# Altium footprint library 全库.PcbLib: 967 footprints (part 47 of 61)
Each footprint in its own frame and in the unit in brackets; x right, y up, seen from the top. Pads: shape width x height; smd on the part's side, far side on the other; paste and mask are expansions set on the pad; w line width, h text height; cw(c..) or ccw(c..) is an arc to the next point about the centre after c.
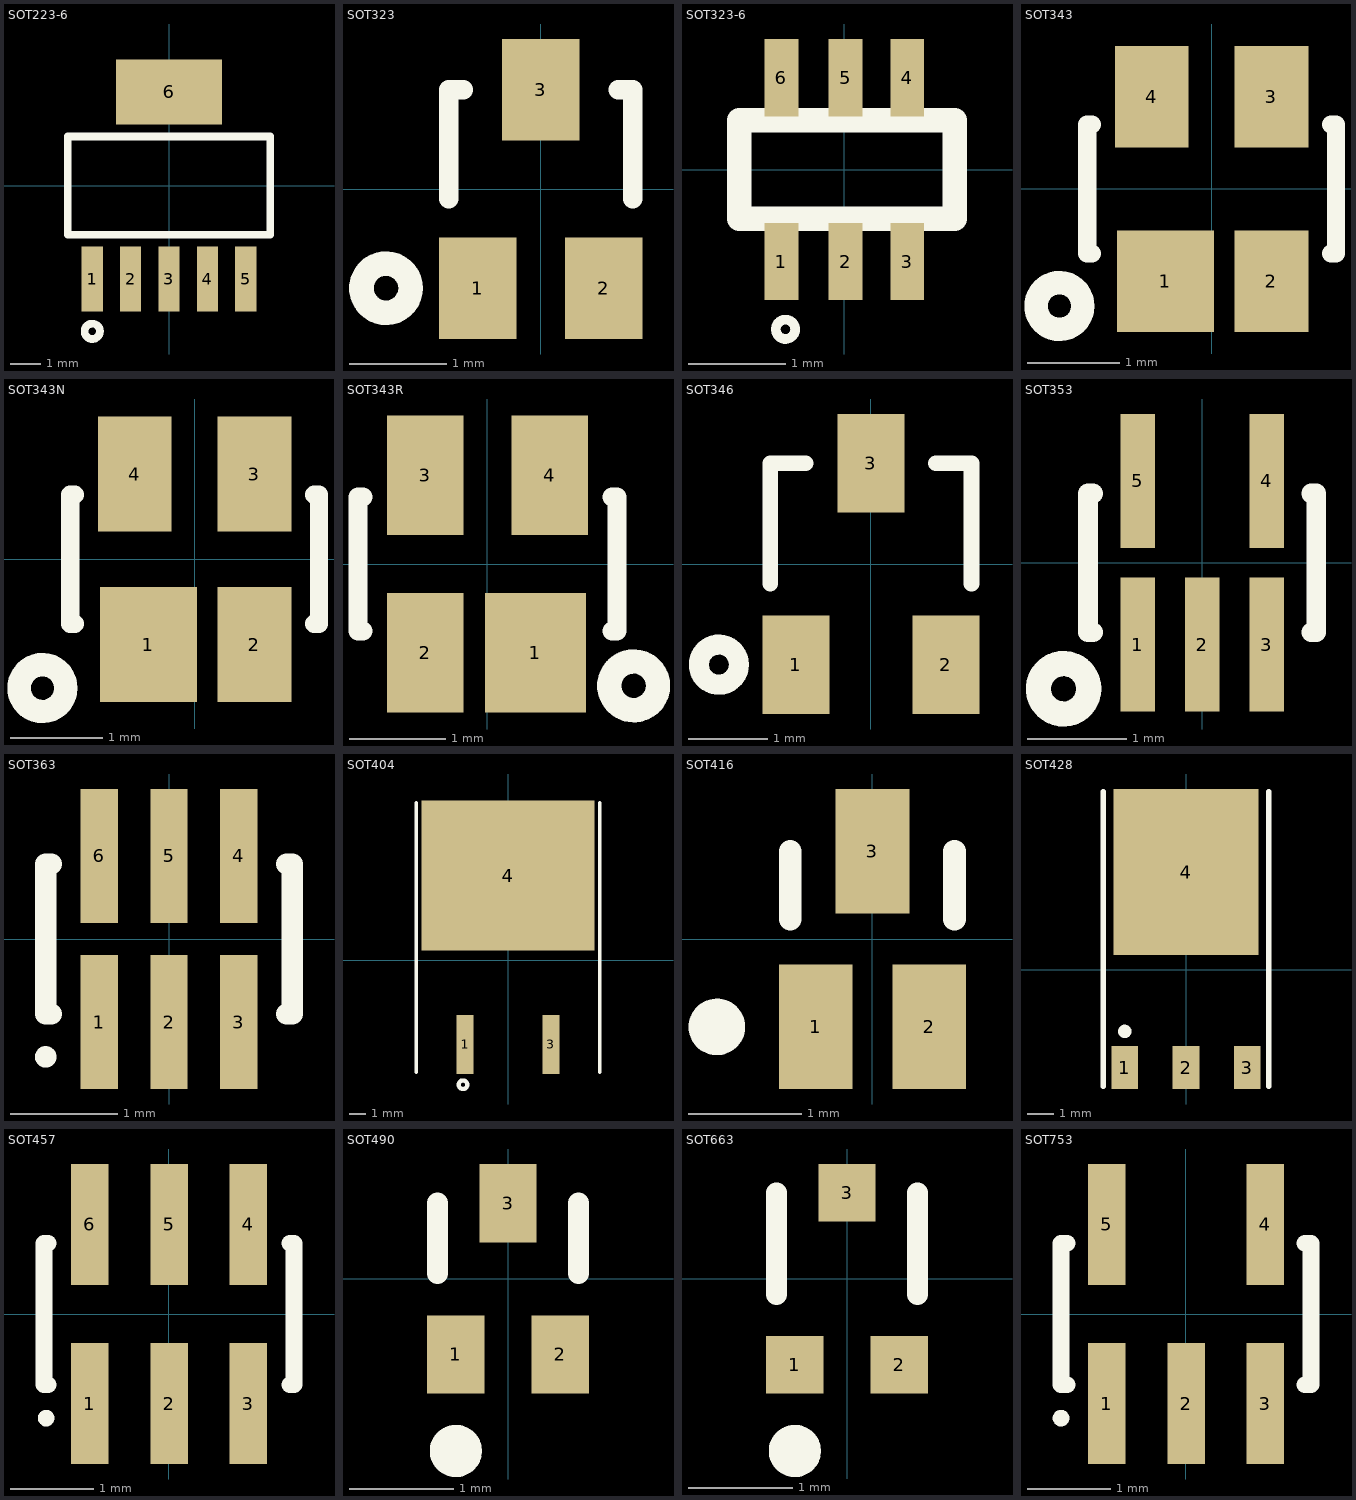
[diagram p46: the footprints below, top view; thin cyan lines are the x and y axes]

## SOT223-6 [mm]
pads (6):
  rect 0.7x2.15 smd: 1(-2.54,-3.1) 2(-1.27,-3.1) 3(0,-3.1) 4(1.27,-3.1) 5(2.54,-3.1)
  rect 3.5x2.15 smd: 6(0,3.1)
Top Overlay:
  circle w0.254: c-2.54,-4.826 r0.254
  lines w0.254: -3.35,-1.625 -3.35,1.625 3.35,1.625 3.35,-1.625 -3.35,-1.625

## SOT323 [mm] "SOT-323/SC-70; 3 Leads; Body 2.2 x 2.2 mm, inc. leads (LxW max)"
height 1.1
pads (3):
  rect 0.8x1.05 smd: 1(-0.65,-1.025) 2(0.65,-1.025) 3(0,1.025)
Top Overlay:
  circle w0.254: c-1.6,-1.025 r0.254
  lines w0.2: -0.95,-0.1 -0.95,1.025 -0.8,1.025 ; 0.8,1.025 0.95,1.025 0.95,-0.1

## SOT323-6 [mm]
pads (6):
  rect 0.35x0.8 smd: 1(-0.65,-0.95) 2(0.013,-0.95) 3(0.65,-0.95) 4(0.65,0.95) 5(0.013,0.95) 6(-0.65,0.95)
Top Overlay:
  circle w0.1: c-0.608,-1.651 r0.1
  lines w0.254: -1.087,-0.508 1.143,-0.508 1.143,0.508 -1.087,0.508 -1.087,-0.508

## SOT343 [mm] "SOT-343; 4 Leads; Body 2.2 x 2.2 mm, inc. leads (LxW max)"
height 1
pads (4):
  rect 1.05x1.1 smd: 1(-0.5,-1)
  rect 0.8x1.1 smd: 2(0.65,-1) 3(0.65,1) 4(-0.65,1)
Top Overlay:
  circle w0.254: c-1.651,-1.27 r0.254
  lines w0.2: -1.3,-0.7 -1.35,-0.7 -1.35,0.7 -1.3,0.7 ; 1.3,-0.7 1.35,-0.7 1.35,0.7 1.3,0.7

## SOT343N [mm] "SOT-343; 4 Leads; Body 2.2 x 2.2 mm, inc. leads (LxW max)"
height 1.1
pads (4):
  rect 1.05x1.25 smd: 1(-0.5,-0.925)
  rect 0.8x1.25 smd: 2(0.65,-0.925) 3(0.65,0.925) 4(-0.65,0.925)
Top Overlay:
  circle w0.254: c-1.651,-1.397 r0.254
  lines w0.2: -1.3,-0.7 -1.35,-0.7 -1.35,0.7 -1.3,0.7 ; 1.3,-0.7 1.35,-0.7 1.35,0.7 1.3,0.7

## SOT343R [mm] "SOT-343; 4 Leads; Body 2.2 x 2.2 mm, inc. leads (LxW max); Reverse Pinning"
height 1.1
pads (4):
  rect 1.05x1.25 smd: 1(0.5,-0.925)
  rect 0.8x1.25 smd: 2(-0.65,-0.925) 3(-0.65,0.925) 4(0.65,0.925)
Top Overlay:
  circle w0.254: c1.524,-1.27 r0.254
  lines w0.2: -1.3,-0.7 -1.35,-0.7 -1.35,0.7 -1.3,0.7 ; 1.3,-0.7 1.35,-0.7 1.35,0.7 1.3,0.7

## SOT346 [mm] "SOT-23; 3 Leads; Body 3.1 x 3.0 mm, inc. leads (LxW max)"
height 1.3
pads (3):
  rect 0.85x1.25 smd: 1(-0.95,-1.275) 2(0.95,-1.275) 3(0,1.275)
Top Overlay:
  circle w0.254: c-1.925,-1.275 r0.254
  lines w0.2: -1.275,-0.25 -1.275,1.275 -0.825,1.275 ; 0.825,1.275 1.275,1.275 1.275,-0.25

## SOT353 [mm] "SOT-353/SC-88A; 5 Leads; Body 2.2 x 2.2 mm, inc. leads (LxW max)"
height 1.1
pads (5):
  rect 0.35x1.35 smd: 1(-0.65,-0.825) 2(0,-0.825) 3(0.65,-0.825) 4(0.65,0.825) 5(-0.65,0.825)
Top Overlay:
  circle w0.254: c-1.397,-1.27 r0.254
  lines w0.2: -1.1,-0.7 -1.15,-0.7 -1.15,0.7 -1.1,0.7 ; 1.1,-0.7 1.15,-0.7 1.15,0.7 1.1,0.7

## SOT363 [mm] "SOT-363/SC-88; 6 Leads; Body 2.2 x 2.2 mm, inc. leads (LxW max)"
height 1.1
pads (6):
  rect 0.35x1.25 smd: 1(-0.65,-0.775) 2(0,-0.775) 3(0.65,-0.775) 4(0.65,0.775) 5(0,0.775) 6(-0.65,0.775)
Top Overlay:
  circle w0.1: c-1.15,-1.1 r0.05
  lines w0.2: -1.1,-0.7 -1.15,-0.7 -1.15,0.7 -1.1,0.7 ; 1.1,-0.7 1.15,-0.7 1.15,0.7 1.1,0.7

## SOT404 [mm] "D2-PAK/TO-263-AB; 3 Leads (1 Cropped); Body 15.4 (inc. leads) x 10.3 mm (LxW max)"
height 4.5
pads (3):
  rect 1x3.5 smd: 1(-2.54,-4.975) 3(2.54,-4.975)
  rect 10.25x8.9 smd: 4(0,5.023)
Top Overlay:
  circle w0.254: c-2.665,-7.366 r0.254
  lines w0.2: -5.425,-6.625 -5.425,9.325 ; 5.425,-6.625 5.425,9.325

## SOT416 [mm] "SOT-416/SC-90/SC-75; 3 Leads; Body 1.8 x 1.8 mm, inc. leads (LxW max)"
height 0.95
pads (3):
  rect 0.65x1.1 smd: 1(-0.5,-0.775) 2(0.5,-0.775) 3(0,0.775)
Top Overlay:
  circle w0.25: c-1.375,-0.777 r0.125
  lines w0.2: -0.725,0.175 -0.725,0.775 ; 0.725,0.175 0.725,0.775

## SOT428 [mm] "D-PAK/TO-252-AA; 3 Leads (1 Cropped); Body 10.4 (inc. leads) x 6.7 mm (LxW max)"
height 2.38
pads (4):
  rect 1x1.6 smd: 1(-2.285,-3.65) 2(0,-3.65) 3(2.285,-3.65)
  rect 5.4x6.2 smd: 4(0,3.65)
Top Overlay:
  circle w0.25: c-2.285,-2.3 r0.125
  lines w0.2: -3.085,-4.35 -3.085,6.65 ; 3.085,-4.35 3.085,6.65

## SOT457 [mm] "SOT-457/SC-74; 6 Leads; Body 3.1 x 3 mm, inc. leads (LxW max)"
height 1.1
pads (6):
  rect 0.45x1.45 smd: 1(-0.95,-1.075) 2(0,-1.075) 3(0.95,-1.075) 4(0.95,1.075) 5(0,1.075) 6(-0.95,1.075)
Top Overlay:
  circle w0.1: c-1.475,-1.25 r0.05
  lines w0.2: -1.45,-0.85 -1.5,-0.85 -1.5,0.85 -1.45,0.85 ; 1.45,-0.85 1.5,-0.85 1.5,0.85 1.45,0.85

## SOT490 [mm] "SC-89; 3 Flat Leads; Body 1.6 x 1.6 x 0.7 mm, inc leads (LxWxH typ)"
height 0.8
pads (3):
  rect 0.55x0.75 smd: 1(-0.5,-0.725) 2(0.5,-0.725) 3(0,0.725)
Top Overlay:
  circle w0.25: c-0.5,-1.65 r0.125
  lines w0.2: -0.676,0.05 -0.676,0.725 ; 0.675,0.05 0.675,0.725

## SOT663 [mm] "SM; 3 Flat Leads; Body 1.6 x 1.6 x 0.6 mm, inc leads (LxWxH typ)"
height 0.6
pads (3):
  rect 0.55x0.55 smd: 1(-0.5,-0.825) 2(0.5,-0.825) 3(0,0.825)
Top Overlay:
  circle w0.25: c-0.5,-1.65 r0.125
  lines w0.2: -0.675,-0.15 -0.675,0.825 ; 0.675,-0.15 0.675,0.825

## SOT753 [mm] "SOT-23/SC-74A; 5 Leads; Body 3.1 x 3 mm, inc. leads (LxW max)"
height 1.1
pads (5):
  rect 0.45x1.45 smd: 1(-0.95,-1.075) 2(0,-1.075) 3(0.95,-1.075) 4(0.95,1.075) 5(-0.95,1.075)
Top Overlay:
  circle w0.1: c-1.5,-1.25 r0.05
  lines w0.2: -1.425,-0.85 -1.5,-0.85 -1.5,0.85 -1.425,0.85 ; 1.425,-0.85 1.5,-0.85 1.5,0.85 1.425,0.85